# Altium footprint library LAN Transformer.PcbLib: 66 footprints (part 5 of 5)
Each footprint in its own frame and in the unit in brackets; x right, y up, seen from the top. Pads: shape width x height; smd on the part's side, far side on the other; paste and mask are expansions set on the pad; w line width, h text height; cw(c..) or ccw(c..) is an arc to the next point about the centre after c.
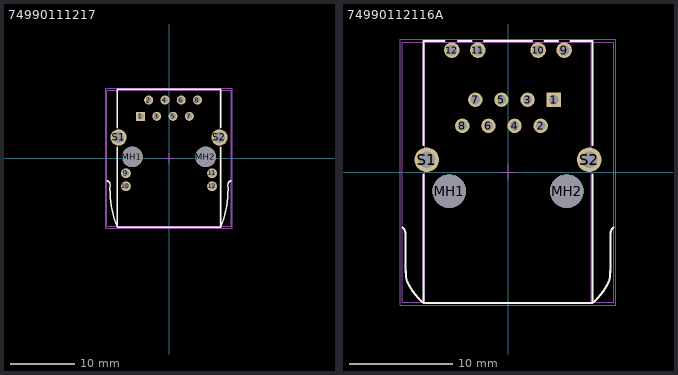
[diagram p4: the footprints below, top view; thin cyan lines are the x and y axes]

## 74990111217 [mm] "LAN Transformer, body 21.3x16mm"
height 15.01
pads (16):
  rect 1.4x1.4 hole 0.89: 1(-4.445,6.55)
  round 1.4 hole 0.89: 2(-3.175,9.09) 3(-1.905,6.55) 4(-0.635,9.09) 5(0.635,6.55) 6(1.905,9.09) 7(3.175,6.55) 8(4.445,9.09)
  round 1.52 hole 1.02: 9(-6.725,-2.34) 10(-6.725,-4.37) 11(6.725,-2.34) 12(6.725,-4.37)
  round 3.2 hole 3.2 unplated: MH1(-5.715,0.2) MH2(5.715,0.2)
  round 2.55 hole 1.7: S1(-7.875,3.25) S2(7.875,3.25)
Top Overlay:
  lines w0.2: -9.707,-3.511 cw(c-9.805,-4.1) -9.208,-4.1 ccw(c7.1,-4.8) -8.113,-10.716 ; -8.1,1.75 -8.1,-10.75 8.1,-10.75 8.1,1.75 ; -8.1,4.75 -8.1,10.75 8.1,10.75 8.1,4.75 ; 8.113,-10.716 ccw(c-7.1,-4.8) 9.208,-4.1 cw(c9.805,-4.1) 9.707,-3.511
Mechanical 11:
  lines w0.1: -8,-10.65 -8,10.65 8,10.65 8,-10.65 -8,-10.65
  text ".Designator" at 0,0 h1
Mechanical 13:
  lines w0.1: -9.724,-10.65 9.724,-10.65 9.724,10.65 -9.724,10.65 -9.724,-10.65
Mechanical 15:
  lines w0.1: -0.8,0 0.8,0 ; 0,-0.8 0,0.8 ; -9.907,-10.95 9.907,-10.95 9.907,10.95 -9.907,10.95 -9.907,-10.95
3D body "74990111217.stp": height 15.34, standoff -3.09, extent -9.724,-10.65 9.724,10.65

## 74990112116A [mm] "LAN Transformer, body 25.3x16.2mm"
height 13.5
pads (16):
  rect 1.4x1.4 hole 0.9: 1(4.445,7.04)
  round 1.4 hole 0.9: 2(3.175,4.5) 3(1.905,7.04) 4(0.635,4.5) 5(-0.635,7.04) 6(-1.905,4.5) 7(-3.175,7.04) 8(-4.445,4.5)
  round 1.52 hole 1.02: 9(5.465,11.87) 10(2.925,11.87) 11(-2.925,11.87) 12(-5.465,11.87)
  round 3.25 hole 3.25 unplated: MH1(-5.715,-1.85) MH2(5.715,-1.85)
  round 2.4 hole 1.6: S1(-7.9,1.2) S2(7.9,1.2)
Top Overlay:
  lines w0.2: -10.285,-5.368 cw(c-10.706,-5.954) -9.992,-6.055 -9.954,-9.455 ccw(c-3.075,-9.355) -9.928,-9.955 ccw(c-7.875,-9.955) -9.803,-10.66 ccw(c-4.375,-8.155) -8.2,-12.75 ; -8.2,-0.22 -8.2,-12.75 ; -8.2,2.62 -8.2,12.75 -6.17,12.75 ; -4.85,12.75 -3.54,12.75 ; -2.32,12.75 2.32,12.75 ; 3.54,12.75 4.85,12.75 ; 6.07,12.75 8.2,12.75 8.2,2.62 ; 8.2,-0.22 8.2,-12.75 ; 10.285,-5.368 ccw(c10.706,-5.954) 9.992,-6.055 9.954,-9.455 cw(c3.075,-9.355) 9.928,-9.955 cw(c7.875,-9.955) 9.803,-10.66 cw(c4.375,-8.155) 8.2,-12.75 ; -8.2,-12.75 8.2,-12.75
Mechanical 11:
  lines w0.1: -8.1,-12.65 -8.1,12.65 8.1,12.65 8.1,-12.65 -8.1,-12.65
  text ".Designator" at 0,0 h1
Mechanical 13:
  lines w0.1: -10.273,-12.65 10.273,-12.65 10.273,12.65 -10.273,12.65 -10.273,-12.65
Mechanical 15:
  lines w0.1: -0.8,0 0.8,0 ; 0,-0.8 0,0.8 ; -10.473,-12.95 -10.473,12.95 10.473,12.95 10.473,-12.95 -10.473,-12.95
3D body "74990112116A.stp": height 15.84, standoff -3.27, extent -10.273,-12.65 10.273,12.65